# Altium footprint library TYCO THD.PcbLib: 146 footprints (part 5 of 11) (continued)
## TYCO_3-1761606-1 [mm] "34 Contacts, Vertical Low Profile IDC Shrouded Header, with Long Eject Latch" (continued)
Mechanical 14:
  drawing of 243 lines, arcs and shapes, not listed
3D body "TYCO_3-1761606-1.stp": height 22.55, standoff -2.59, extent -25.4,-5.588 25.4,4.826

## TYCO_3-1761608-1 [mm] "34 Contacts, Vertical Low Profile IDC Shrouded Header, with Short Eject Latch"
height 18.79
pads (34):
  round 1.6 hole 0.9: 1(-20.32,-1.27) 2(-20.32,1.27) 3(-17.78,-1.27) 4(-17.78,1.27) 5(-15.24,-1.27) 6(-15.24,1.27) 7(-12.7,-1.27) 8(-12.7,1.27) 9(-10.16,-1.27) 10(-10.16,1.27) 11(-7.62,-1.27) 12(-7.62,1.27) 13(-5.08,-1.27) 14(-5.08,1.27) 15(-2.54,-1.27) 16(-2.54,1.27) 17(0,-1.27) 18(0,1.27) 19(2.54,-1.27) 20(2.54,1.27) 21(5.08,-1.27) 22(5.08,1.27) 23(7.62,-1.27) 24(7.62,1.27) 25(10.16,-1.27) 26(10.16,1.27) 27(12.7,-1.27) 28(12.7,1.27) 29(15.24,-1.27) 30(15.24,1.27) 31(17.78,-1.27) 32(17.78,1.27) 33(20.32,-1.27) 34(20.32,1.27)
Top Overlay:
  circle w0.3: c-20.315,-5.125 r0.15
  lines w0.2: -24.028,-4.191 -24.079,-4.191 -24.079,-4.369 -25.4,-4.369 -25.4,4.826 -24.079,4.826 -24.079,4.369 0,4.369 0,4.826 2.54,4.826 2.54,4.369 24.079,4.369 24.079,4.826 25.4,4.826 25.4,-4.369 24.079,-4.369 24.079,-4.191 24.029,-4.191 ; -24.028,-3.581 -24.079,-3.581 -24.079,3.81 -21.336,3.81 -21.336,1.909 ; -24.028,0.33 -22.834,0.33 -22.834,-5.565 ; -22.834,-4.191 -21.336,-4.191 -21.336,-4.369 21.336,-4.369 21.336,-4.191 22.835,-4.191 ; -22.834,-3.2 22.835,-3.2 ; -21.387,-4.191 -21.387,-5.588 -24.028,-5.588 -24.028,3.226 -21.387,3.226 -21.387,1.819 ; -21.387,-3.2 -21.387,-1.819 ; -21.387,-0.721 -21.387,0.721 ; -21.387,3.2 21.387,3.2 ; -21.336,-3.2 -21.336,-1.909 ; -21.336,-0.631 -21.336,0.631 ; -20.574,-4.369 -20.574,-4.191 -19.05,-4.191 -19.05,-4.369 ; -19.812,-4.369 -19.812,-4.191 ; -18.516,-4.369 -18.516,-3.886 -14.503,-3.886 -14.503,-4.369 ; -17.564,-3.886 -17.564,-3.2 ; -15.456,-3.886 -15.456,-3.2 ; -2.54,-4.369 -2.54,-3.2 ; 2.54,-4.369 2.54,-3.2 ; 16.904,-4.369 16.904,-3.886 20.917,-3.886 20.917,-4.369 ; 17.856,-3.886 17.856,-3.2 ; 19.965,-3.886 19.965,-3.2 ; 21.336,-3.2 21.336,-1.909 ; 21.336,-0.631 21.336,0.631 ; 21.336,1.909 21.336,3.81 24.079,3.81 24.079,-3.581 24.029,-3.581 ; 21.387,-4.191 21.387,-5.588 24.029,-5.588 24.029,3.226 21.387,3.226 21.387,1.819 ; 21.387,-3.2 21.387,-1.819 ; 21.387,-0.721 21.387,0.721 ; 22.835,-5.565 22.835,0.33 24.029,0.33
Mechanical 8:
  lines w0.1: -20.82,-1.27 -20.32,-1.27 ; -20.82,1.27 -20.32,1.27 ; -20.32,-1.77 -20.32,-1.27 ; -20.32,-0.77 -20.32,-1.27 ; -20.32,0.77 -20.32,1.27 ; -20.32,1.77 -20.32,1.27 ; -19.82,-1.27 -20.32,-1.27 ; -19.82,1.27 -20.32,1.27 ; -18.28,-1.27 -17.78,-1.27 ; -18.28,1.27 -17.78,1.27 ; -17.78,-1.77 -17.78,-1.27 ; -17.78,-0.77 -17.78,-1.27 ; -17.78,0.77 -17.78,1.27 ; -17.78,1.77 -17.78,1.27 ; -17.28,-1.27 -17.78,-1.27 ; -17.28,1.27 -17.78,1.27 ; -15.74,-1.27 -15.24,-1.27 ; -15.74,1.27 -15.24,1.27 ; -15.24,-1.77 -15.24,-1.27 ; -15.24,-0.77 -15.24,-1.27 ; -15.24,0.77 -15.24,1.27 ; -15.24,1.77 -15.24,1.27 ; -14.74,-1.27 -15.24,-1.27 ; -14.74,1.27 -15.24,1.27 ; -13.2,-1.27 -12.7,-1.27 ; -13.2,1.27 -12.7,1.27 ; -12.7,-1.77 -12.7,-1.27 ; -12.7,-0.77 -12.7,-1.27 ; -12.7,0.77 -12.7,1.27 ; -12.7,1.77 -12.7,1.27 ; -12.2,-1.27 -12.7,-1.27 ; -12.2,1.27 -12.7,1.27 ; -10.66,-1.27 -10.16,-1.27 ; -10.66,1.27 -10.16,1.27 ; -10.16,-1.77 -10.16,-1.27 ; -10.16,-0.77 -10.16,-1.27 ; -10.16,0.77 -10.16,1.27 ; -10.16,1.77 -10.16,1.27 ; -9.66,-1.27 -10.16,-1.27 ; -9.66,1.27 -10.16,1.27 ; -8.12,-1.27 -7.62,-1.27 ; -8.12,1.27 -7.62,1.27 ; -7.62,-1.77 -7.62,-1.27 ; -7.62,-0.77 -7.62,-1.27 ; -7.62,0.77 -7.62,1.27 ; -7.62,1.77 -7.62,1.27 ; -7.12,-1.27 -7.62,-1.27 ; -7.12,1.27 -7.62,1.27 ; -5.58,-1.27 -5.08,-1.27 ; -5.58,1.27 -5.08,1.27 ; -5.08,-1.77 -5.08,-1.27 ; -5.08,-0.77 -5.08,-1.27 ; -5.08,0.77 -5.08,1.27 ; -5.08,1.77 -5.08,1.27 ; -4.58,-1.27 -5.08,-1.27 ; -4.58,1.27 -5.08,1.27 ; -3.04,-1.27 -2.54,-1.27 ; -3.04,1.27 -2.54,1.27 ; -2.54,-1.77 -2.54,-1.27 ; -2.54,-0.77 -2.54,-1.27 ; -2.54,0.77 -2.54,1.27 ; -2.54,1.77 -2.54,1.27 ; -2.04,-1.27 -2.54,-1.27 ; -2.04,1.27 -2.54,1.27 ; -0.5,-1.27 0,-1.27 ; -0.5,0 0,0 ; -0.5,1.27 0,1.27 ; 0,-1.77 0,-1.27 ; 0,-0.77 0,-1.27 ; 0,-0.5 0,0 ; 0,0.5 0,0 ; 0,0.77 0,1.27 ; 0,1.77 0,1.27 ; 0.5,-1.27 0,-1.27 ; 0.5,0 0,0 ; 0.5,1.27 0,1.27 ; 2.04,-1.27 2.54,-1.27 ; 2.04,1.27 2.54,1.27 ; 2.54,-1.77 2.54,-1.27 ; 2.54,-0.77 2.54,-1.27 ; 2.54,0.77 2.54,1.27 ; 2.54,1.77 2.54,1.27 ; 3.04,-1.27 2.54,-1.27 ; 3.04,1.27 2.54,1.27 ; 4.58,-1.27 5.08,-1.27 ; 4.58,1.27 5.08,1.27 ; 5.08,-1.77 5.08,-1.27 ; 5.08,-0.77 5.08,-1.27 ; 5.08,0.77 5.08,1.27 ; 5.08,1.77 5.08,1.27 ; 5.58,-1.27 5.08,-1.27 ; 5.58,1.27 5.08,1.27 ; 7.12,-1.27 7.62,-1.27 ; 7.12,1.27 7.62,1.27 ; 7.62,-1.77 7.62,-1.27 ; 7.62,-0.77 7.62,-1.27 ; 7.62,0.77 7.62,1.27 ; 7.62,1.77 7.62,1.27 ; 8.12,-1.27 7.62,-1.27 ; 8.12,1.27 7.62,1.27 ; 9.66,-1.27 10.16,-1.27 ; 9.66,1.27 10.16,1.27 ; 10.16,-1.77 10.16,-1.27 ; 10.16,-0.77 10.16,-1.27 ; 10.16,0.77 10.16,1.27 ; 10.16,1.77 10.16,1.27 ; 10.66,-1.27 10.16,-1.27 ; 10.66,1.27 10.16,1.27 ; 12.2,-1.27 12.7,-1.27 ; 12.2,1.27 12.7,1.27 ; 12.7,-1.77 12.7,-1.27 ; 12.7,-0.77 12.7,-1.27 ; 12.7,0.77 12.7,1.27 ; 12.7,1.77 12.7,1.27 ; 13.2,-1.27 12.7,-1.27 ; 13.2,1.27 12.7,1.27 ; 14.74,-1.27 15.24,-1.27 ; 14.74,1.27 15.24,1.27 ; 15.24,-1.77 15.24,-1.27 ; 15.24,-0.77 15.24,-1.27 ; 15.24,0.77 15.24,1.27 ; 15.24,1.77 15.24,1.27 ; 15.74,-1.27 15.24,-1.27 ; 15.74,1.27 15.24,1.27 ; 17.28,-1.27 17.78,-1.27 ; 17.28,1.27 17.78,1.27 ; 17.78,-1.77 17.78,-1.27 ; 17.78,-0.77 17.78,-1.27 ; 17.78,0.77 17.78,1.27 ; 17.78,1.77 17.78,1.27 ; 18.28,-1.27 17.78,-1.27 ; 18.28,1.27 17.78,1.27 ; 19.82,-1.27 20.32,-1.27 ; 19.82,1.27 20.32,1.27 ; 20.32,-1.77 20.32,-1.27 ; 20.32,-0.77 20.32,-1.27 ; 20.32,0.77 20.32,1.27 ; 20.32,1.77 20.32,1.27 ; 20.82,-1.27 20.32,-1.27 ; 20.82,1.27 20.32,1.27
Mechanical 14:
  drawing of 211 lines, arcs and shapes, not listed
3D body "TYCO_3-1761608-1.stp": height 18.79, standoff -2.59, extent -25.4,-5.588 25.4,4.826

## TYCO_4-1437514-5 [mm] "Press-in HOLTITE Socket for Round Lead 0.64 to 0.89mm Diameter or 0.64mm² Rectangular Lead (3.56mm max PCB Thickness)"
height 3.56
pads (1):
  round 2.1 hole 1.6: 1(0,0)
Drill Drawing:
  text "PRESS-FIT Diam=1.6mm +0.02/-0.07" at -12.5,-0.5 h1
3D body "TYCO_7-1437514-0.stp": height 0.04, standoff -3.42, extent -0.736,-0.736 0.737,0.737

## TYCO_5-103735-2 [mm] "3 Circuits, Pitch 2.54mm, Vertical Single-Row Polarized/Latching AMPMODU MTE Header"
height 13.79
pads (3):
  round 1.6 hole 0.9: 1(-2.54,0) 2(0,0) 3(2.54,0)
Top Overlay:
  circle w0.3: c-4.669,-3.398 r0.15
  lines w0.2: -5.08,-0.051 -4.064,-0.051 ; -5.08,1.473 -4.064,1.473 ; -4.572,-0.051 -4.572,-1.956 ; -4.572,1.473 -4.572,2.108 ; -3.429,-4.064 -3.429,-3.81 -2.159,-3.81 -2.159,-4.064 ; -3.093,-3.81 -3.16,-4.064 -3.81,-4.064 -3.81,-2.54 -5.08,-2.54 -5.08,2.54 -4.318,2.54 -3.937,2.921 -3.683,2.921 -3.302,2.54 -1.727,2.54 -1.346,2.921 -1.092,2.921 -0.711,2.54 3.302,2.54 3.683,2.921 3.937,2.921 4.318,2.54 5.08,2.54 5.08,-2.54 3.81,-2.54 3.81,-4.064 -2.428,-4.064 -2.428,-3.81 ; -2.794,-2.54 2.794,-2.54 ; -2.794,-1.956 -1.524,-1.956 ; -1.905,2.108 -4.572,2.108 ; -1.905,2.54 -1.905,1.6 -4.064,1.6 ; -1.524,-2.54 -1.524,-1.448 -4.064,-1.448 ; -0.533,2.108 4.572,2.108 ; -0.533,2.54 -0.533,1.6 4.064,1.6 ; 1.524,-2.54 1.524,-1.448 4.064,-1.448 ; 1.524,-1.956 2.794,-1.956 ; 4.064,-0.051 5.08,-0.051 ; 4.064,1.473 5.08,1.473 ; 4.572,-0.051 4.572,-1.956 ; 4.572,1.473 4.572,2.108 ; -4.572,-1.956 -4.064,-1.448 ; -4.572,-1.956 -3.302,-1.956 ; -4.572,2.108 -4.064,1.6 ; -4.064,-1.448 -4.064,1.6 ; -3.302,-3.556 -3.302,-1.956 ; -3.302,-3.556 -2.794,-3.048 ; -3.302,-3.556 3.302,-3.556 ; -3.302,-1.956 -2.794,-1.448 -2.794,-3.048 ; -2.794,-3.048 2.794,-3.048 ; 2.794,-3.048 2.794,-1.448 3.302,-1.956 ; 2.794,-3.048 3.302,-3.556 ; 3.302,-3.556 3.302,-1.956 ; 3.302,-1.956 4.572,-1.956 ; 4.064,-1.448 4.064,1.6 ; 4.064,-1.448 4.572,-1.956 ; 4.064,1.6 4.572,2.108
Mechanical 8:
  lines w0.1: -3.04,0 -2.54,0 ; -2.54,-0.5 -2.54,0 ; -2.54,0.5 -2.54,0 ; -2.04,0 -2.54,0 ; -0.5,0 0,0 ; 0,-0.5 0,0 ; 0,0.5 0,0 ; 0.5,0 0,0 ; 2.04,0 2.54,0 ; 2.54,-0.5 2.54,0 ; 2.54,0.5 2.54,0 ; 3.04,0 2.54,0
Mechanical 14:
  lines w0.1: -5.08,-0.051 -4.064,-0.051 ; -5.08,1.473 -4.064,1.473 ; -4.572,-0.051 -4.572,-1.956 ; -4.572,1.473 -4.572,2.108 ; -3.429,-4.064 -3.429,-3.81 -2.159,-3.81 -2.159,-4.064 ; -3.093,-3.81 -3.16,-4.064 -3.81,-4.064 -3.81,-2.54 -5.08,-2.54 -5.08,2.54 -4.318,2.54 -3.937,2.921 -3.683,2.921 -3.302,2.54 -1.727,2.54 -1.346,2.921 -1.092,2.921 -0.711,2.54 3.302,2.54 3.683,2.921 3.937,2.921 4.318,2.54 5.08,2.54 5.08,-2.54 3.81,-2.54 3.81,-4.064 -2.428,-4.064 -2.428,-3.81 ; -2.794,-2.54 2.794,-2.54 ; -2.794,-1.956 -1.524,-1.956 ; -1.905,2.108 -4.572,2.108 ; -1.905,2.54 -1.905,1.6 -4.064,1.6 ; -1.524,-2.54 -1.524,-1.448 -4.064,-1.448 ; -0.533,2.108 4.572,2.108 ; -0.533,2.54 -0.533,1.6 4.064,1.6 ; 1.524,-2.54 1.524,-1.448 4.064,-1.448 ; 1.524,-1.956 2.794,-1.956 ; 2.222,-0.324 2.222,-0.686 2.858,-0.686 2.858,-0.318 ; 4.064,-0.051 5.08,-0.051 ; 4.064,1.473 5.08,1.473 ; 4.572,-0.051 4.572,-1.956 ; 4.572,1.473 4.572,2.108 ; -4.572,-1.956 -4.064,-1.448 ; -4.572,-1.956 -3.302,-1.956 ; -4.572,2.108 -4.064,1.6 ; -4.064,-1.448 -4.064,1.6 ; -3.302,-3.556 -3.302,-1.956 ; -3.302,-3.556 -2.794,-3.048 ; -3.302,-3.556 3.302,-3.556 ; -3.302,-1.956 -2.794,-1.448 -2.794,-3.048 ; -2.858,-0.318 -2.222,-0.318 ; -2.858,-0.318 -2.858,0.318 ; -2.858,-0.318 -2.858,-0.686 -2.222,-0.686 -2.222,-0.318 ; -2.858,0.318 -2.222,0.318 ; -2.858,0.318 -2.858,0.686 -2.222,0.686 -2.222,0.318 ; -2.794,-3.048 2.794,-3.048 ; -2.222,-0.318 -2.222,0.318 ; -0.318,-0.318 0.318,-0.318 ; -0.318,-0.318 -0.318,0.318 ; -0.318,-0.318 -0.318,-0.686 0.318,-0.686 0.318,-0.318 ; -0.318,0.318 0.318,0.318 ; -0.318,0.318 -0.318,0.686 0.318,0.686 0.318,0.318 ; 0.318,-0.318 0.318,0.318 ; 2.222,0.318 2.222,-0.318 2.858,-0.318 ; 2.222,0.318 2.858,0.318 ; 2.222,0.318 2.222,0.686 2.858,0.686 2.858,0.318 ; 2.794,-3.048 2.794,-1.448 3.302,-1.956 ; 2.794,-3.048 3.302,-3.556 ; 2.858,-0.318 2.858,0.318 ; 3.302,-3.556 3.302,-1.956 ; 3.302,-1.956 4.572,-1.956 ; 4.064,-1.448 4.064,1.6 ; 4.064,-1.448 4.572,-1.956 ; 4.064,1.6 4.572,2.108
3D body "TYCO_5-103735-2.stp": height 13.59, standoff -3.3, extent -5.08,-4.064 5.08,2.921

## TYCO_5-104069-6 [mm] "40 Contacts, Pitch 1.27mm, Dual-Row, Right Angle, AMPMODU System 50 Board-to-Board Connectors"
height 8.89
pads (42):
  oval 0.9x1.15 hole 0.6: 1(-12.065,-1.27) 2(-12.065,1.27) 3(-10.795,-1.27) 4(-10.795,1.27) 5(-9.525,-1.27) 6(-9.525,1.27) 7(-8.255,-1.27) 8(-8.255,1.27) 9(-6.985,-1.27) 10(-6.985,1.27) 11(-5.715,-1.27) 12(-5.715,1.27) 13(-4.445,-1.27) 14(-4.445,1.27) 15(-3.175,-1.27) 16(-3.175,1.27) 17(-1.905,-1.27) 18(-1.905,1.27) 19(-0.635,-1.27) 20(-0.635,1.27) 21(0.635,-1.27) 22(0.635,1.27) 23(1.905,-1.27) 24(1.905,1.27) 25(3.175,-1.27) 26(3.175,1.27) 27(4.445,-1.27) 28(4.445,1.27) 29(5.715,-1.27) 30(5.715,1.27) 31(6.985,-1.27) 32(6.985,1.27) 33(8.255,-1.27) 34(8.255,1.27) 35(9.525,-1.27) 36(9.525,1.27) 37(10.795,-1.27) 38(10.795,1.27) 39(12.065,-1.27) 40(12.065,1.27)
  round 2.2 hole 1.5: 41(10.795,5.359) 42(-10.795,5.359)
Top Overlay:
  circle w0.3: c-12.1,-2.7 r0.15
  lines w0.2: -14.199,1.981 -12.695,1.981 ; -12.557,-2.083 -14.199,-2.083 -14.199,4.214 -14.351,5.664 -15.875,5.664 -15.875,7.188 -14.351,7.188 -14.351,11.633 14.351,11.633 14.351,7.188 15.875,7.188 15.875,5.664 14.351,5.664 14.199,4.214 14.199,-2.083 12.557,-2.083 ; -12.446,11.633 -12.065,10.211 -11.684,11.633 ; -3.81,10.109 3.81,10.109 ; -3.81,11.633 -3.81,7.823 -1.524,7.823 -1.524,4.267 1.524,4.267 1.524,7.823 3.81,7.823 3.81,11.633 ; -2.794,7.823 -2.794,10.109 ; -0.838,4.267 -0.838,7.442 -0.432,7.442 -0.432,4.267 ; 0.432,4.267 0.432,7.442 0.838,7.442 0.838,4.267 ; 2.794,7.823 2.794,10.109 ; 12.695,1.981 14.199,1.981
  text "40" at 14.785,0.636 h1.2
Mechanical 8:
  drawing of 172 lines, arcs and shapes, not listed
Mechanical 14:
  lines w0.1: -14.199,1.981 14.199,1.981 ; -12.446,11.633 -12.065,10.211 -11.684,11.633 ; -3.81,10.109 3.81,10.109 ; -3.81,11.633 -3.81,7.823 -1.524,7.823 -1.524,4.267 1.524,4.267 1.524,7.823 3.81,7.823 3.81,11.633 ; -2.794,7.823 -2.794,10.109 ; -0.838,4.267 -0.838,7.442 -0.432,7.442 -0.432,4.267 ; 0.432,4.267 0.432,7.442 0.838,7.442 0.838,4.267 ; 2.794,7.823 2.794,10.109 ; -15.875,5.664 -14.351,5.664 -14.199,4.214 -14.199,-2.083 14.199,-2.083 14.199,4.214 14.351,5.664 15.875,5.664 15.875,7.188 14.351,7.188 14.351,11.633 -14.351,11.633 -14.351,7.188 -15.875,7.188 -15.875,5.664
  text "40" at 14.785,0.636 h1.2
3D body "TYCO_5-104069-6.stp": height 8.89, standoff -2.54, extent -15.875,-2.083 15.875,11.633

## TYCO_5-104362-4 [mm] "5 Circuits, Single-Row 2.54mm Centerline, Shrouded Polarized/Latching MTE Header With Swage"
height 13.79
pads (5):
  round 1.8 hole 1.1: 1(-5.08,0) 2(-2.54,0) 3(0,0) 4(2.54,0) 5(5.08,0)
Top Overlay:
  circle w0.3: c-5.177,-3.347 r0.15
  lines w0.2: -7.62,-0.127 -6.604,-0.127 ; -7.62,1.397 -6.604,1.397 ; -7.112,-0.127 -7.112,-2.032 ; -7.112,1.397 -7.112,2.032 ; -5.715,-2.54 -5.715,-2.286 -4.445,-2.286 -4.445,-2.54 ; -5.446,-2.54 -5.446,-2.286 ; -4.714,-2.54 -4.714,-2.286 ; -2.794,-2.54 -1.524,-2.54 ; -2.794,-2.032 -1.524,-2.032 ; 1.524,-2.032 2.794,-2.032 ; 2.794,-2.54 1.524,-2.54 ; 6.604,-0.127 7.62,-0.127 ; 6.604,1.397 7.62,1.397 ; 7.112,-0.127 7.112,-2.032 ; 7.112,1.397 7.112,2.032 ; -7.112,-2.032 -6.604,-1.524 ; -7.112,-2.032 -3.302,-2.032 ; -7.112,2.032 -6.604,1.524 ; -7.112,2.032 7.112,2.032 ; -6.604,-1.524 -1.524,-1.524 -1.524,-2.54 ; -6.604,-1.524 -6.604,1.524 ; -6.604,1.524 -4.445,1.524 -4.445,2.54 -7.62,2.54 -7.62,-2.54 -3.81,-2.54 -3.81,-4.064 3.81,-4.064 3.81,-2.54 7.62,-2.54 7.62,2.54 4.445,2.54 4.445,1.524 6.604,1.524 ; -3.302,-3.556 -2.794,-3.048 ; -3.302,-3.556 -3.302,-2.032 ; -3.302,-3.556 3.302,-3.556 ; -3.302,-2.032 -2.794,-1.524 -2.794,-3.048 ; -2.794,-3.048 2.794,-3.048 ; -1.524,-2.54 1.524,-2.54 ; 1.524,-2.54 1.524,-1.524 6.604,-1.524 ; 2.794,-3.048 3.302,-3.556 ; 2.794,-3.048 2.794,-1.524 3.302,-2.032 ; 3.302,-3.556 3.302,-2.032 ; 3.302,-2.032 7.112,-2.032 ; 6.604,-1.524 7.112,-2.032 ; 6.604,-1.524 6.604,1.524 ; 6.604,1.524 7.112,2.032 ; -3.175,1.524 3.175,1.524 3.175,2.54 -3.175,2.54 -3.175,1.524
Mechanical 8:
  lines w0.1: -5.58,0 -5.08,0 ; -5.08,-0.5 -5.08,0 ; -5.08,0.5 -5.08,0 ; -4.58,0 -5.08,0 ; -3.04,0 -2.54,0 ; -2.54,-0.5 -2.54,0 ; -2.54,0.5 -2.54,0 ; -2.04,0 -2.54,0 ; -0.5,0 0,0 ; 0,-0.5 0,0 ; 0,0.5 0,0 ; 0.5,0 0,0 ; 2.04,0 2.54,0 ; 2.54,-0.5 2.54,0 ; 2.54,0.5 2.54,0 ; 3.04,0 2.54,0 ; 4.58,0 5.08,0 ; 5.08,-0.5 5.08,0 ; 5.08,0.5 5.08,0 ; 5.58,0 5.08,0
Mechanical 14:
  lines w0.1: -7.62,-0.127 -6.604,-0.127 ; -7.62,1.397 -6.604,1.397 ; -7.112,-0.127 -7.112,-2.032 ; -7.112,1.397 -7.112,2.032 ; -5.715,-2.54 -5.715,-2.286 -4.445,-2.286 -4.445,-2.54 ; -5.446,-2.54 -5.446,-2.286 ; -4.714,-2.54 -4.714,-2.286 ; -2.794,-2.54 -1.524,-2.54 ; -2.794,-2.032 -1.524,-2.032 ; 1.524,-2.032 2.794,-2.032 ; 2.794,-2.54 1.524,-2.54 ; 6.604,-0.127 7.62,-0.127 ; 6.604,1.397 7.62,1.397 ; 7.112,-0.127 7.112,-2.032 ; 7.112,1.397 7.112,2.032 ; -7.112,-2.032 -6.604,-1.524 ; -7.112,-2.032 -3.302,-2.032 ; -7.112,2.032 -6.604,1.524 ; -7.112,2.032 7.112,2.032 ; -6.604,-1.524 -1.524,-1.524 -1.524,-2.54 ; -6.604,-1.524 -6.604,1.524 ; -6.604,1.524 -4.445,1.524 -4.445,2.54 -7.62,2.54 -7.62,-2.54 -3.81,-2.54 -3.81,-4.064 3.81,-4.064 3.81,-2.54 7.62,-2.54 7.62,2.54 4.445,2.54 4.445,1.524 6.604,1.524 ; -3.302,-3.556 -2.794,-3.048 ; -3.302,-3.556 -3.302,-2.032 ; -3.302,-3.556 3.302,-3.556 ; -3.302,-2.032 -2.794,-1.524 -2.794,-3.048 ; -2.794,-3.048 2.794,-3.048 ; -1.524,-2.54 1.524,-2.54 ; 1.524,-2.54 1.524,-1.524 6.604,-1.524 ; 2.794,-3.048 3.302,-3.556 ; 2.794,-3.048 2.794,-1.524 3.302,-2.032 ; 3.302,-3.556 3.302,-2.032 ; 3.302,-2.032 7.112,-2.032 ; 6.604,-1.524 7.112,-2.032 ; 6.604,-1.524 6.604,1.524 ; 6.604,1.524 7.112,2.032 ; -3.175,1.524 3.175,1.524 3.175,2.54 -3.175,2.54 -3.175,1.524
3D body "TYCO_5-104362-4.stp": height 13.59, standoff -3.3, extent -7.62,-4.064 7.62,2.54

## TYCO_5-794630-0 [mm] "20 Circuits Dual-Row - Vertical Micro MATE-N-LOK Connector"
height 9.24
pads (20):
  round 1.8 hole 1.1: 1(13.5,-1.5) 2(10.5,-1.5) 3(7.5,-1.5) 4(4.5,-1.5) 5(1.5,-1.5) 6(-1.5,-1.5) 7(-4.5,-1.5) 8(-7.5,-1.5) 9(-10.5,-1.5) 10(-13.5,-1.5) 11(13.5,1.5) 12(10.5,1.5) 13(7.5,1.5) 14(4.5,1.5) 15(1.5,1.5) 16(-1.5,1.5) 17(-4.5,1.5) 18(-7.5,1.5) 19(-10.5,1.5) 20(-13.5,1.5)
Top Overlay:
  lines w0.2: -15.86,-1 -15.43,-1 ; -15.86,1 -15.43,1 ; -13.25,-3.43 cw(c-13.25,-3.63) -13.05,-3.63 -13.05,-3.94 -11.8,-3.94 -11.8,-3.63 cw(c-11.6,-3.63) -11.6,-3.43 ; -1.3,3.43 ccw(c-1.3,4.03) -0.7,4.03 -0.7,4.73 0.7,4.73 0.7,4.03 ccw(c1.3,4.03) 1.3,3.43 ; 11.6,-3.43 cw(c11.6,-3.63) 11.8,-3.63 11.8,-3.94 13.05,-3.94 13.05,-3.63 cw(c13.25,-3.63) 13.25,-3.43 ; 15.43,-1 15.86,-1 ; 15.43,1 15.86,1 ; -16.22,-1.5 -15.86,-1.5 -15.86,1.5 -16.22,1.5 ; -16.22,-1.5 -17,-1.05 -17,1.05 -16.22,1.5 ; -16.22,-1.5 -16.22,1.5 ; 16.22,-1.5 15.86,-1.5 15.86,1.5 16.22,1.5 ; 16.22,-1.5 16.22,1.5 ; 16.22,-1.5 17,-1.05 17,1.05 16.22,1.5 ; -15.43,-3.43 15.43,-3.43 15.43,3.43 -15.43,3.43 -15.43,-3.43 ; -14.81,-2.11 -14.81,-0.19 -12.19,-0.19 -12.19,-2.81 -14.11,-2.81 -14.81,-2.11 ; -14.81,0.89 -14.81,2.81 -12.19,2.81 -12.19,0.19 -14.11,0.19 -14.81,0.89 ; -11.81,-2.11 -11.81,-0.19 -9.19,-0.19 -9.19,-2.81 -11.11,-2.81 -11.81,-2.11 ; -11.81,0.19 -11.81,2.81 -9.19,2.81 -9.19,0.89 -9.89,0.19 -11.81,0.19 ; -8.81,-2.11 -8.81,-0.19 -6.19,-0.19 -6.19,-2.81 -8.11,-2.81 -8.81,-2.11 ; -8.81,0.19 -8.81,2.81 -6.19,2.81 -6.19,0.89 -6.89,0.19 -8.81,0.19 ; -5.81,-2.81 -3.89,-2.81 -3.19,-2.11 -3.19,-0.19 -5.81,-0.19 -5.81,-2.81 ; -5.81,0.19 -5.81,2.81 -3.19,2.81 -3.19,0.89 -3.89,0.19 -5.81,0.19 ; -2.81,-2.81 -0.89,-2.81 -0.19,-2.11 -0.19,-0.19 -2.81,-0.19 -2.81,-2.81 ; -2.81,0.89 -2.81,2.81 -0.19,2.81 -0.19,0.19 -2.11,0.19 -2.81,0.89 ; 0.19,-2.11 0.19,-0.19 2.81,-0.19 2.81,-2.81 0.89,-2.81 0.19,-2.11 ; 0.19,0.89 0.19,2.81 2.81,2.81 2.81,0.19 0.89,0.19 0.19,0.89 ; 3.19,-2.11 3.19,-0.19 5.81,-0.19 5.81,-2.81 3.89,-2.81 3.19,-2.11 ; 3.19,0.19 3.19,2.81 5.81,2.81 5.81,0.89 5.11,0.19 3.19,0.19 ; 6.19,-2.81 8.11,-2.81 8.81,-2.11 8.81,-0.19 6.19,-0.19 6.19,-2.81 ; 6.19,0.19 6.19,2.81 8.81,2.81 8.81,0.89 8.11,0.19 6.19,0.19 ; 9.19,-2.11 9.19,-0.19 11.81,-0.19 11.81,-2.81 9.89,-2.81 9.19,-2.11 ; 9.19,0.89 9.19,2.81 11.81,2.81 11.81,0.19 9.89,0.19 9.19,0.89 ; 12.19,-2.81 14.81,-2.81 14.81,-0.19 12.19,-0.19 12.19,-2.81 ; 12.19,0.89 12.19,2.81 14.81,2.81 14.81,0.19 12.89,0.19 12.19,0.89
  text "1" at 13.875,-5.275 h1.2
  text "20" at -14.37,4.068 h1.2
  text "10" at -15.27,-5.282 h1.2
  text "11" at 12.93,4.068 h1.2
Mechanical 8:
  lines w0.1: -14,-1.5 -13.5,-1.5 ; -14,1.5 -13.5,1.5 ; -13.5,-2 -13.5,-1.5 ; -13.5,-1 -13.5,-1.5 ; -13.5,1 -13.5,1.5 ; -13.5,2 -13.5,1.5 ; -13,-1.5 -13.5,-1.5 ; -13,1.5 -13.5,1.5 ; -11,-1.5 -10.5,-1.5 ; -11,1.5 -10.5,1.5 ; -10.5,-2 -10.5,-1.5 ; -10.5,-1 -10.5,-1.5 ; -10.5,1 -10.5,1.5 ; -10.5,2 -10.5,1.5 ; -10,-1.5 -10.5,-1.5 ; -10,1.5 -10.5,1.5 ; -8,-1.5 -7.5,-1.5 ; -8,1.5 -7.5,1.5 ; -7.5,-2 -7.5,-1.5 ; -7.5,-1 -7.5,-1.5 ; -7.5,1 -7.5,1.5 ; -7.5,2 -7.5,1.5 ; -7,-1.5 -7.5,-1.5 ; -7,1.5 -7.5,1.5 ; -5,-1.5 -4.5,-1.5 ; -5,1.5 -4.5,1.5 ; -4.5,-2 -4.5,-1.5 ; -4.5,-1 -4.5,-1.5 ; -4.5,1 -4.5,1.5 ; -4.5,2 -4.5,1.5 ; -4,-1.5 -4.5,-1.5 ; -4,1.5 -4.5,1.5 ; -2,-1.5 -1.5,-1.5 ; -2,1.5 -1.5,1.5 ; -1.5,-2 -1.5,-1.5 ; -1.5,-1 -1.5,-1.5 ; -1.5,1 -1.5,1.5 ; -1.5,2 -1.5,1.5 ; -1,-1.5 -1.5,-1.5 ; -1,1.5 -1.5,1.5 ; -0.5,0 0,0 ; 0,-0.5 0,0 ; 0,0.5 0,0 ; 0.5,0 0,0 ; 1,-1.5 1.5,-1.5 ; 1,1.5 1.5,1.5 ; 1.5,-2 1.5,-1.5 ; 1.5,-1 1.5,-1.5 ; 1.5,1 1.5,1.5 ; 1.5,2 1.5,1.5 ; 2,-1.5 1.5,-1.5 ; 2,1.5 1.5,1.5 ; 4,-1.5 4.5,-1.5 ; 4,1.5 4.5,1.5 ; 4.5,-2 4.5,-1.5 ; 4.5,-1 4.5,-1.5 ; 4.5,1 4.5,1.5 ; 4.5,2 4.5,1.5 ; 5,-1.5 4.5,-1.5 ; 5,1.5 4.5,1.5 ; 7,-1.5 7.5,-1.5 ; 7,1.5 7.5,1.5 ; 7.5,-2 7.5,-1.5 ; 7.5,-1 7.5,-1.5 ; 7.5,1 7.5,1.5 ; 7.5,2 7.5,1.5 ; 8,-1.5 7.5,-1.5 ; 8,1.5 7.5,1.5 ; 10,-1.5 10.5,-1.5 ; 10,1.5 10.5,1.5 ; 10.5,-2 10.5,-1.5 ; 10.5,-1 10.5,-1.5 ; 10.5,1 10.5,1.5 ; 10.5,2 10.5,1.5 ; 11,-1.5 10.5,-1.5 ; 11,1.5 10.5,1.5 ; 13,-1.5 13.5,-1.5 ; 13,1.5 13.5,1.5 ; 13.5,-2 13.5,-1.5 ; 13.5,-1 13.5,-1.5 ; 13.5,1 13.5,1.5 ; 13.5,2 13.5,1.5 ; 14,-1.5 13.5,-1.5 ; 14,1.5 13.5,1.5
Mechanical 14:
  drawing of 216 lines, arcs and shapes, not listed
  text "1" at 13.875,-5.275 h1.2
  text "20" at -14.37,4.068 h1.2
  text "10" at -15.27,-5.282 h1.2
  text "11" at 12.93,4.068 h1.2
3D body "TYCO_5-794630-0.stp": height 9.24, standoff -3.18, extent -17,-3.94 17,4.73

## TYCO_5-1634503-1 [mm] "Low Profile Straight 50 Ohm BNC PCB Socket"
height 13.7
pads (5):
  round 1.8 hole 1.1: 1(0,0)
  round 2.3 hole 1.6: 2(-3.23,-3.23) 2(-3.23,3.23) 2(3.23,-3.23) 2(3.23,3.23)
Top Overlay:
  circle w0.2: c0,0 r2.38
  lines w0.2: -4.665,-2.914 cw(c0,0) -4.665,2.914 ; -4.299,-2.112 cw(c0,0) -4.299,2.112 ; -3.813,-1.739 cw(c0,0) -3.813,1.739 ; -2.914,-4.665 ccw(c0,0) -0.99,-5.41 ; -2.914,4.665 cw(c0,0) -0.99,5.41 ; -2.112,-4.299 ccw(c0,0) 2.112,-4.299 ; -2.112,4.299 cw(c0,0) 2.112,4.299 ; -1.739,-3.813 ccw(c0,0) 1.739,-3.813 ; -1.739,3.813 cw(c0,0) 1.739,3.813 ; -0.99,-4.686 -0.99,-5.51 0.991,-5.51 0.991,-4.686 ; -0.99,4.686 -0.99,5.51 0.991,5.51 0.991,4.686 ; 0.991,-5.41 ccw(c0,0) 2.914,-4.665 ; 0.991,5.41 cw(c0,0) 2.914,4.665 ; 3.813,-1.739 ccw(c0,0) 3.813,1.739 ; 4.299,-2.112 ccw(c0,0) 4.299,2.112 ; 4.665,-2.914 ccw(c0,0) 4.665,2.914
Mechanical 8:
  lines w0.1: -3.63,-3.13 -3.13,-3.13 ; -3.63,3.13 -3.13,3.13 ; -3.13,-3.63 -3.13,-3.13 ; -3.13,-2.63 -3.13,-3.13 ; -3.13,2.63 -3.13,3.13 ; -3.13,3.63 -3.13,3.13 ; -2.63,-3.13 -3.13,-3.13 ; -2.63,3.13 -3.13,3.13 ; -0.5,0 0,0 ; 0,-0.5 0,0 ; 0,0.5 0,0 ; 0.5,0 0,0 ; 2.63,-3.13 3.13,-3.13 ; 2.63,3.13 3.13,3.13 ; 3.13,-3.63 3.13,-3.13 ; 3.13,-2.63 3.13,-3.13 ; 3.13,2.63 3.13,3.13 ; 3.13,3.63 3.13,3.13 ; 3.63,-3.13 3.13,-3.13 ; 3.63,3.13 3.13,3.13
Mechanical 14:
  circle w0.1: c0,0 r0.762
  circle w0.1: c0,0 r1.067
  circle w0.1: c0,0 r2.38
  circle w0.1: c0,0 r4.191
  circle w0.1: c0,0 r4.79
  lines w0.1: -0.99,-5.41 cw(c0,0) -0.99,5.41 ; -0.99,-4.686 -0.99,-5.51 0.991,-5.51 0.991,-4.686 ; -0.99,4.686 -0.99,5.51 0.991,5.51 0.991,4.686 ; 0.991,-5.41 ccw(c0,0) 0.991,5.41
3D body "TYCO_5-1634503-1.stp": height 13.7, standoff -4.9, extent -5.5,-5.51 5.5,5.51

## TYCO_5-1634506-1 [mm] "50 Ohm BNC PCB Receptacle (Jack), Post Terminal, 4 Legs"
height 16.7
pads (5):
  round 2 hole 1.3: 1(0,0)
  round 3.1 hole 2.4: 2(-3.43,-3.43) 2(-3.43,3.43) 2(3.43,-3.43) 2(3.43,3.43)
Top Overlay:
  circle w0.2: c0,0 r2.5
  lines w0.2: -5.027,-2.311 cw(c0,0) -5.027,2.311 ; -4.695,-1 -5.5,-1 -5.5,1 -4.695,1 ; -4.46,-1.774 cw(c0,0) -4.46,1.774 ; -4.099,-1.598 cw(c0,0) -4.099,1.598 ; -2.311,-5.027 ccw(c0,0) 2.311,-5.027 ; -2.311,5.027 cw(c0,0) 2.311,5.027 ; -1.774,-4.46 ccw(c0,0) 1.774,-4.46 ; -1.774,4.46 cw(c0,0) 1.774,4.46 ; -1.598,-4.099 ccw(c0,0) 1.598,-4.099 ; -1.598,4.099 cw(c0,0) 1.598,4.099 ; 4.099,-1.598 ccw(c0,0) 4.099,1.598 ; 4.46,-1.774 ccw(c0,0) 4.46,1.774 ; 4.695,-1 5.5,-1 5.5,1 4.695,1 ; 5.027,-2.311 ccw(c0,0) 5.027,2.311
Mechanical 8:
  lines w0.1: -4.43,-3.43 -3.43,-3.43 ; -4.43,3.43 -3.43,3.43 ; -3.43,-4.43 -3.43,-3.43 ; -3.43,-2.43 -3.43,-3.43 ; -3.43,2.43 -3.43,3.43 ; -3.43,4.43 -3.43,3.43 ; -2.43,-3.43 -3.43,-3.43 ; -2.43,3.43 -3.43,3.43 ; -1,0 0,0 ; 0,-1 0,0 ; 0,1 0,0 ; 0,4.3 0,5.3 ; 1,0 0,0 ; 2.43,-3.43 3.43,-3.43 ; 2.43,3.43 3.43,3.43 ; 3.43,-4.43 3.43,-3.43 ; 3.43,-2.43 3.43,-3.43 ; 3.43,2.43 3.43,3.43 ; 3.43,4.43 3.43,3.43 ; 4.43,-3.43 3.43,-3.43 ; 4.43,3.43 3.43,3.43
Mechanical 14:
  circle w0.1: c0,0 r5.533
  circle w0.1: c0,0 r4.4
  circle w0.1: c0,0 r4.8
  circle w0.1: c0,0 r2.5
  circle w0.1: c0,0 r1
  circle w0.1: c0,0 r0.4
  lines w0.1: -4.695,-1 -5.5,-1 -5.5,1 -4.695,1 ; 4.695,-1 5.5,-1 5.5,1 4.695,1
3D body "TYCO_5-1634506-1.stp": height 16.7, standoff -3.18, extent -5.5,-5.5 5.5,5.5